# Altium footprint library CUSTOM PCB.PcbLib: 404 footprints (part 9 of 26)
Each footprint in its own frame and in the unit in brackets; x right, y up, seen from the top. Pads: shape width x height; smd on the part's side, far side on the other; paste and mask are expansions set on the pad; w line width, h text height; cw(c..) or ccw(c..) is an arc to the next point about the centre after c.
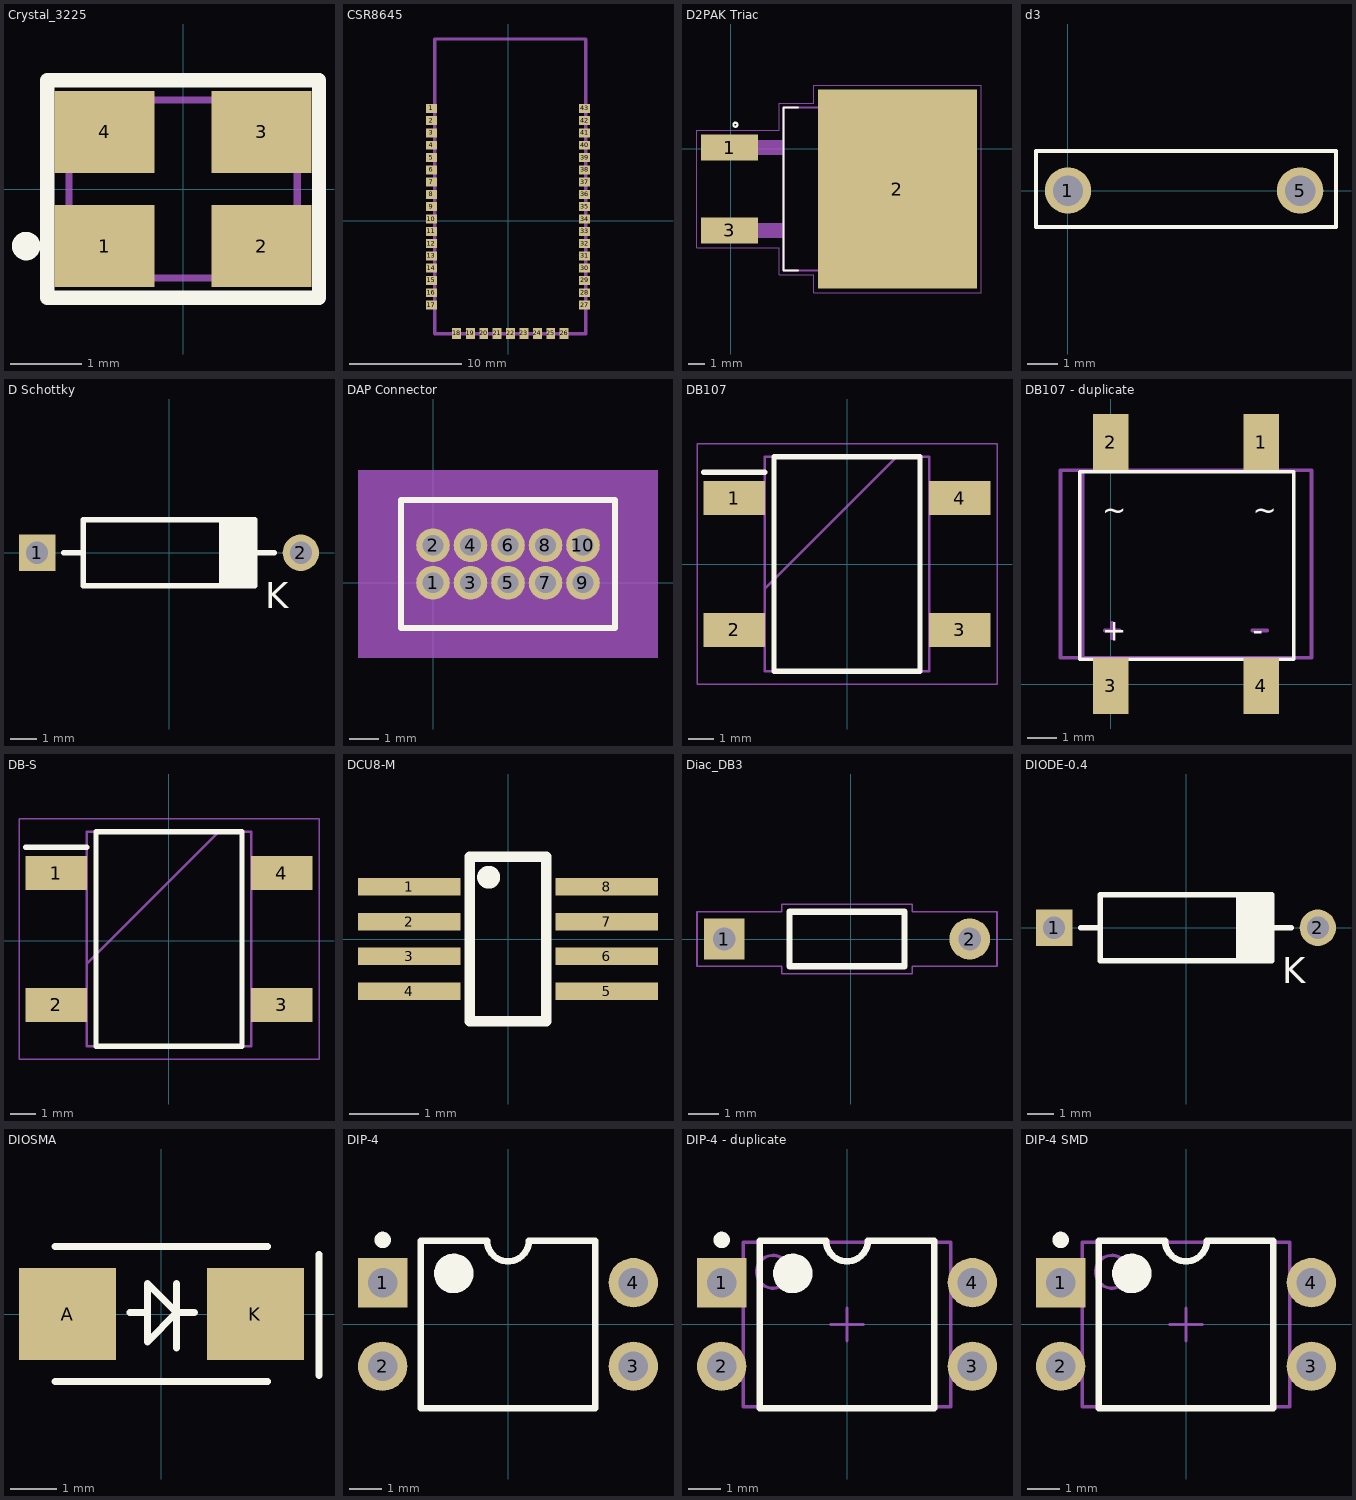
[diagram p8: the footprints below, top view; thin cyan lines are the x and y axes]

## Crystal_3225 [mm] "3225 pack"
pads (4):
  rect 1.4x1.15 smd: 1(-1.1,-0.8) 2(1.1,-0.8) 3(1.1,0.8) 4(-1.1,0.8)
Top Overlay:
  circle w0.2: c-2.2,-0.8 r0.1
  lines w0.2: -1.905,-1.524 1.905,-1.524 1.905,1.524 -1.905,1.524 -1.905,-1.524
Mechanical 15:
  lines w0.1: -1.6,-1.25 1.6,-1.25 1.6,1.25 -1.6,1.25 -1.6,-1.25
3D body "User Library-tsx-3225.STEP": height 0.52, standoff -0.08, extent -1.6,-1.23 1.6,1.27

## CSR8645 [mm]
pads (43):
  rect 1x0.8 smd: 1(-6.858,10.07) 2(-6.858,8.97) 3(-6.858,7.87) 4(-6.858,6.77) 5(-6.858,5.67) 6(-6.858,4.57) 7(-6.858,3.47) 8(-6.858,2.37) 9(-6.858,1.27) 10(-6.858,0.17) 11(-6.858,-0.93) 12(-6.858,-2.03) 13(-6.858,-3.13) 14(-6.858,-4.23) 15(-6.858,-5.33) 16(-6.858,-6.43) 17(-6.858,-7.53) 27(6.858,-7.53) 28(6.858,-6.43) 29(6.858,-5.33) 30(6.858,-4.23) 31(6.858,-3.13) 32(6.858,-2.03) 33(6.858,-0.93) 34(6.858,0.17) 35(6.858,1.27) 36(6.858,2.37) 37(6.858,3.47) 38(6.858,4.57) 39(6.858,5.67) 40(6.858,6.77) 41(6.858,7.87) 42(6.858,8.97) 43(6.858,10.07)
  rect 0.8x1 smd: 18(-4.604,-10.07) 19(-3.372,-10.07) 20(-2.172,-10.07) 21(-0.972,-10.07) 22(0.228,-10.07) 23(1.428,-10.07) 24(2.628,-10.07) 25(3.828,-10.07) 26(5.028,-10.07)
Mechanical 1:
  lines w0.3: -6.554,-10.109 -6.554,16.281 6.946,16.281 6.946,-10.109 -6.554,-10.109

## D2PAK Triac [mm] "T850-6G"
pads (3):
  rect 3.5x1.6 smd: 1(-0.071,0.076) 3(-0.071,-5.004)
  rect 9.75x12.2 smd: 2(10.204,-2.464)
Top Overlay:
  circle w0.127: c0.279,1.473 r0.127
  lines w0.127: 4.115,-7.464 3.229,-7.464 3.229,2.536 4.115,2.536
Top Paste:
  region: 7.939,-0.102 6.559,-0.102 6.559,1.366 7.939,1.366
  region: 8.531,1.366 9.909,1.366 9.909,-0.102 8.531,-0.102
  region: 7.939,-6.298 6.559,-6.298 6.559,-4.824 7.939,-4.824
  region: 8.532,-4.824 9.909,-4.824 9.909,-6.298 8.532,-6.298
  region: 8.531,-2.759 9.909,-2.759 9.909,-4.23 8.531,-4.23
  region: 8.532,-0.699 9.909,-0.699 9.909,-2.168 8.532,-2.168
  region: 7.939,-2.168 6.559,-2.168 6.559,-0.699 7.939,-0.699
  region: 7.939,-4.23 6.559,-4.23 6.559,-2.759 7.939,-2.759
  region: 12.48,-4.824 13.849,-4.824 13.849,-6.301 12.48,-6.301
  region: 11.879,-6.3 10.506,-6.3 10.506,-4.824 11.879,-4.824
  region: 12.474,1.366 13.849,1.366 13.849,-0.102 12.474,-0.102
  region: 11.879,-0.101 10.503,-0.101 10.503,1.366 11.879,1.366
  region: 11.879,-2.168 10.506,-2.168 10.506,-0.699 11.879,-0.699
  region: 11.879,-4.231 10.504,-4.231 10.504,-2.759 11.879,-2.759
  region: 12.473,-2.759 13.849,-2.759 13.849,-4.23 12.473,-4.23
  region: 12.479,-0.699 13.849,-0.699 13.849,-2.168 12.479,-2.168
Mechanical 4:
  region: -1.587,-4.554 3.229,-4.554 3.229,-5.46 -1.587,-5.46
  region: -1.586,0.526 3.229,0.526 3.229,-0.37 -1.586,-0.37
  region: -1.587,-4.554 3.229,-4.554 3.229,-5.46 -1.587,-5.46
  region: -1.586,0.526 3.229,0.526 3.229,-0.37 -1.586,-0.37
  lines w0.127: 3.229,-7.464 3.229,2.536 ; 3.229,-7.464 14.029,-7.464 ; 3.229,-7.464 3.229,2.536 ; 3.229,-7.464 14.029,-7.464 ; 3.229,2.536 14.029,2.536 ; 3.229,2.536 14.029,2.536 ; 14.029,-7.464 14.029,2.536 ; 14.029,-7.464 14.029,2.536
Mechanical 16:
  lines w0.05: -2.071,-6.064 -2.071,1.136 2.979,1.136 2.979,2.786 5.079,2.786 5.079,3.886 15.329,3.886 15.329,-8.814 5.079,-8.814 5.079,-7.714 2.979,-7.714 2.979,-6.064 -2.071,-6.064
3D body "TO263-2-1.stp": height 4.22, standoff 0, extent -1.086,-7.349 13.499,2.472
3D body: height 0.25, standoff 0, extent 21.666,-0.152 21.666,-0.152

## d3 [mil] "Schottky"
pads (2):
  round 60 hole 39.37: 1(0,0) 5(300,0)
Top Overlay:
  lines w5: -41.34,-47.24 -41.34,51.18 346.46,51.18 346.46,-47.24 -41.34,-47.24

## D Schottky [mm] "Diode, Thru-Hole; 2 Leads; 0.4 in Pin Spacing"
height 2.54
pads (2):
  rect 1.4x1.4 hole 0.85: 1(-5.08,0)
  round 1.4 hole 0.85: 2(5.08,0)
Top Overlay:
  lines w0.2: -4.064,0 -3.302,0 ; 2.032,-1.27 2.032,1.27 ; 3.302,0 4.064,0 ; -3.302,-1.27 3.302,-1.27 3.302,1.27 -3.302,1.27 -3.302,-1.27
  lines w0.5: 2.325,1.054 2.325,-1.05 3.04,-1.05 3.04,1.025 2.6,1.025 ; 2.65,-0.775 2.675,-0.775 ; 2.65,-0.525 2.65,0.675
  text "K" at 3.702,-2.137 h1
3D body "do-41.STEP": height 2, standoff -2.5, extent -5.457,-1.031 5.343,0.979

## DAP Connector [mil] "XMC1100 programmer connector 10 pin"
pads (10):
  round 45 hole 27.95: 1(0,0) 2(0,50) 3(50,0) 4(50,50) 5(100,0) 6(100,50) 7(150,0) 8(150,50) 9(200,0) 10(200,50)
Top Overlay:
  lines w7.87: -42.72,-60.24 242.72,-60.24 242.72,110.24 -42.72,110.24 -42.72,-60.24
Top Solder:
  circle w0: c0,0 r24.51
  circle w0: c0,50 r24.51
  circle w0: c50,0 r24.51
  circle w0: c50,50 r24.51
  circle w0: c100,0 r24.51
  circle w0: c100,50 r24.51
  circle w0: c150,0 r24.51
  circle w0: c150,50 r24.51
  circle w0: c200,0 r24.51
  circle w0: c200,50 r24.51
Bottom Solder:
  circle w0: c0,0 r24.51
  circle w0: c0,50 r24.51
  circle w0: c50,0 r24.51
  circle w0: c50,50 r24.51
  circle w0: c100,0 r24.51
  circle w0: c100,50 r24.51
  circle w0: c150,0 r24.51
  circle w0: c150,50 r24.51
  circle w0: c200,0 r24.51
  circle w0: c200,50 r24.51
Mechanical 1:
  region: -100,-100 -100,150 300,150 300,-100
  lines w3.94: -25,-42.48 25,-42.48 ; -25,-42.48 25,-42.48 ; -25,-42.48 -25,92.48 ; -25,92.48 25,92.48 ; -25,92.48 25,92.48 ; -7.99,-7.99 -7.99,7.99 ; -7.99,-7.99 7.99,-7.99 ; -7.99,-7.99 7.99,-7.99 ; -7.99,-7.99 -7.99,7.99 ; -7.99,7.99 7.99,7.99 ; -7.99,7.99 7.99,7.99 ; -7.99,42.01 -7.99,57.99 ; -7.99,42.01 7.99,42.01 ; -7.99,42.01 7.99,42.01 ; -7.99,42.01 -7.99,57.99 ; -7.99,57.99 7.99,57.99 ; -7.99,57.99 7.99,57.99 ; 7.99,-7.99 7.99,7.99 ; 7.99,-7.99 7.99,7.99 ; 7.99,42.01 7.99,57.99 ; 7.99,42.01 7.99,57.99 ; 25,-42.48 75,-42.48 ; 25,-42.48 75,-42.48 ; 25,92.48 75,92.48 ; 25,92.48 75,92.48 ; 42.01,-7.99 42.01,7.99 ; 42.01,-7.99 57.99,-7.99 ; 42.01,-7.99 57.99,-7.99 ; 42.01,-7.99 42.01,7.99 ; 42.01,7.99 57.99,7.99 ; 42.01,7.99 57.99,7.99 ; 42.01,42.01 42.01,57.99 ; 42.01,42.01 57.99,42.01 ; 42.01,42.01 57.99,42.01 ; 42.01,42.01 42.01,57.99 ; 42.01,57.99 57.99,57.99 ; 42.01,57.99 57.99,57.99 ; 57.99,-7.99 57.99,7.99 ; 57.99,-7.99 57.99,7.99 ; 57.99,42.01 57.99,57.99 ; 57.99,42.01 57.99,57.99 ; 75,-42.48 125,-42.48 ; 75,-42.48 125,-42.48 ; 75,92.48 125,92.48 ; 75,92.48 125,92.48 ; 92.01,-7.99 92.01,7.99 ; 92.01,-7.99 107.99,-7.99 ; 92.01,-7.99 107.99,-7.99 ; 92.01,-7.99 92.01,7.99 ; 92.01,7.99 107.99,7.99 ; 92.01,7.99 107.99,7.99 ; 92.01,42.01 92.01,57.99 ; 92.01,42.01 107.99,42.01 ; 92.01,42.01 107.99,42.01 ; 92.01,42.01 92.01,57.99 ; 92.01,57.99 107.99,57.99 ; 92.01,57.99 107.99,57.99 ; 107.99,-7.99 107.99,7.99 ; 107.99,-7.99 107.99,7.99 ; 107.99,42.01 107.99,57.99 ; 107.99,42.01 107.99,57.99 ; 125,-42.48 175,-42.48 ; 125,-42.48 175,-42.48 ; 125,92.48 175,92.48 ; 125,92.48 175,92.48 ; 142.01,-7.99 142.01,7.99 ; 142.01,-7.99 157.99,-7.99 ; 142.01,-7.99 157.99,-7.99 ; 142.01,-7.99 142.01,7.99 ; 142.01,7.99 157.99,7.99 ; 142.01,7.99 157.99,7.99 ; 142.01,42.01 142.01,57.99 ; 142.01,42.01 157.99,42.01 ; 142.01,42.01 157.99,42.01 ; 142.01,42.01 142.01,57.99 ; 142.01,57.99 157.99,57.99 ; 142.01,57.99 157.99,57.99 ; 157.99,-7.99 157.99,7.99 ; 157.99,-7.99 157.99,7.99 ; 157.99,42.01 157.99,57.99 ; 157.99,42.01 157.99,57.99 ; 175,-42.48 225,-42.48 225,92.48 175,92.48 ; 192.01,-7.99 207.99,-7.99 207.99,7.99 192.01,7.99 192.01,-7.99 ; 192.01,42.01 207.99,42.01 207.99,57.99 192.01,57.99 192.01,42.01
Mechanical 4:
  region: -26.97,-44.49 -26.97,94.49 226.97,94.49 226.97,-44.49

## DB107 [mm]
pads (4):
  rect 2.375x1.3 smd: 1(-4.362,2.55) 2(-4.362,-2.55) 3(4.362,-2.55) 4(4.362,2.55)
Top Overlay:
  lines w0.2: -5.55,3.55 -3.175,3.55 ; -2.825,-4.15 -2.825,4.15 2.825,4.15 2.825,-4.15 -2.825,-4.15
Mechanical 15:
  lines w0.1: -3.175,-0.95 1.925,4.15 ; -3.175,-4.15 -3.175,4.15 3.175,4.15 3.175,-4.15 -3.175,-4.15
Mechanical 20:
  lines w0.05: -5.8,-4.65 -5.8,4.65 5.8,4.65 5.8,-4.65 -5.8,-4.65
3D body "DB107S.stp": height 3.4, standoff 0, extent -5.026,-4.125 4.874,4.175

## DB107 - duplicate [mm]
pads (4):
  rect 1.2x1.9 smd: 1(5.09,8.188) 2(-0.01,8.188) 3(-0.01,-0.062) 4(5.09,-0.062)
Top Overlay:
  lines w0.127: -1.051,0.838 6.188,0.838 6.188,7.188 -1.051,7.188 -1.051,0.838
  text "-" at 4.791,1.473 h0.71
  text "~" at 4.791,5.537 h0.71
  text "+" at -0.289,1.473 h0.71
  text "~" at -0.289,5.537 h0.71
Mechanical 1:
  lines w0.127: -0.96,7.234 -0.96,0.888 ; -0.21,1.814 0.29,1.814 ; 0.04,1.564 0.04,2.064 ; 4.79,1.814 5.29,1.814 ; -0.96,0.888 -1.71,0.888 -1.71,7.238 6.79,7.238 6.79,0.888 -0.96,0.888
3D body "SDIP4L.stp": height 3.65, standoff 0.04, extent -1.678,-1.041 6.809,9.201

## DB-S [mm] "Rectifier IC"
pads (4):
  rect 2.375x1.3 smd: 1(-4.362,2.614) 2(-4.362,-2.486) 3(4.362,-2.486) 4(4.362,2.614)
Top Overlay:
  lines w0.2: -5.55,3.614 -3.175,3.614 ; -2.825,-4.086 2.825,-4.086 2.825,4.214 -2.825,4.214 -2.825,-4.086
Mechanical 15:
  lines w0.1: -3.175,-0.886 1.925,4.214 ; -3.175,-4.086 3.175,-4.086 3.175,4.214 -3.175,4.214 -3.175,-4.086
Mechanical 20:
  lines w0.05: -5.8,-4.586 5.8,-4.586 5.8,4.714 -5.8,4.714 -5.8,-4.586
3D body "DB107S.stp": height 3.4, standoff 0, extent -4.95,-4.15 4.95,4.15

## DCU8-M [mil]
pads (8):
  rect 58x10 smd paste+0 mask+0: 1(-56,29.53) 2(-56,9.84) 3(-56,-9.84) 4(-56,-29.53) 5(56,-29.53) 6(56,-9.84) 7(56,9.84) 8(56,29.53)
Top Overlay:
  circle w7: c-11,35 r3
  lines w6: -21.68,-46.5 21.68,-46.5 21.68,46.5 -21.68,46.5 -21.68,-46.5
3D body "DCU8.step": height 35.12, standoff 0, extent -62.99,-41.5 62.99,41.5

## Diac_DB3 [mm]
pads (2):
  rect 1.35x1.35 hole 0.75: 1(-4.177,0)
  round 1.35 hole 0.75: 2(3.923,0)
Top Overlay:
  lines w0.2: -2.027,-0.9 -2.027,0.9 1.773,0.9 1.773,-0.9 -2.027,-0.9
Mechanical 4:
  lines w0.05: -5.077,-0.9 -2.277,-0.9 -2.277,-1.15 2.023,-1.15 2.023,-0.9 4.823,-0.9 4.823,0.9 2.023,0.9 2.023,1.15 -2.277,1.15 -2.277,0.9 -5.077,0.9 -5.077,-0.9

## DIODE-0.4 [mm] "Diode, Thru-Hole; 2 Leads; 0.4 in Pin Spacing"
height 2.54
pads (2):
  rect 1.4x1.4 hole 0.85: 1(-5.08,0)
  round 1.4 hole 0.85: 2(5.08,0)
Top Overlay:
  lines w0.2: -4.064,0 -3.302,0 ; 2.032,-1.27 2.032,1.27 ; 3.302,0 4.064,0 ; -3.302,-1.27 -3.302,1.27 3.302,1.27 3.302,-1.27 -3.302,-1.27
  lines w0.5: 2.325,1.054 2.325,-1.05 3.04,-1.05 3.04,1.025 2.6,1.025 ; 2.65,-0.775 2.675,-0.775 ; 2.65,-0.525 2.65,0.675
  text "K" at 3.702,-2.137 h1
3D body "do-41.STEP": height 2, standoff -2.5, extent -5.457,-1.031 5.343,0.979

## DIOSMA [mm]
pads (2):
  rect 2.1x2 smd: A(-2.032,0) K(2.032,0)
Top Overlay:
  lines w0.15: -2.3,-1.46 2.3,-1.46 ; -2.3,1.46 2.3,1.46 ; -0.686,0.029 -0.305,0.029 ; 0.33,-0.733 0.33,0.664 ; 0.711,0.029 0.33,0.029 ; 3.409,-1.332 3.409,1.293 ; 0.33,0.029 -0.305,-0.606 -0.305,0.664 0.33,0.029
3D body "DO-214AC(SMA).x_t": height 2.29, standoff 0, extent -2.744,-1.397 2.743,1.397

## DIP-4 [mm] "DIP; 4 Leads; Row Spacing 7.62 mm; Pitch 2.54 mm"
height 5.6
pads (4):
  rect 1.5x1.5 hole 0.9: 1(-3.81,1.27)
  round 1.5 hole 0.9: 2(-3.81,-1.27) 3(3.81,-1.27) 4(3.81,1.27)
Top Overlay:
  circle w0.6: c-1.65,1.55 r0.3
  circle w0.25: c-3.81,2.57 r0.125
  lines w0.2: -2.65,-2.55 2.65,-2.55 2.65,2.55 0.635,2.55 cw(c0,2.55) -0.635,2.55 -2.65,2.55 -2.65,-2.55
3D body "CircuitWorks-DIP4.step": height 3.31, standoff -4.28, extent -4,-2.77 4,2.77

## DIP-4 - duplicate [mm] "DIP; 4 Leads; Row Spacing 7.62 mm; Pitch 2.54 mm"
height 5.6
pads (4):
  rect 1.5x1.5 hole 0.9: 1(-3.81,1.27)
  round 1.5 hole 0.9: 2(-3.81,-1.27) 3(3.81,-1.27) 4(3.81,1.27)
Top Overlay:
  circle w0.25: c-3.81,2.57 r0.125
  circle w0.6: c-1.65,1.55 r0.3
  lines w0.2: -2.65,-2.55 -2.65,2.55 -0.635,2.55 ccw(c0,2.55) 0.635,2.55 2.65,2.55 2.65,-2.55 -2.65,-2.55
Mechanical 13:
  circle w0.1: c-2.25,1.6 r0.5
  lines w0.1: -3.15,-2.5 -3.15,2.5 3.15,2.5 3.15,-2.5 -3.15,-2.5
Mechanical 15:
  lines w0.1: -0.5,0 0.5,0 ; 0,-0.5 0,0.5
3D body "IC_4P.stp": height 3.81, standoff -3.37, extent -3.935,-2.5 3.935,2.58

## DIP-4 SMD [mm] "DIP; 4 Leads; Row Spacing 7.62 mm; Pitch 2.54 mm"
height 5.6
pads (4):
  rect 1.5x1.5 hole 0.9: 1(-3.81,1.27)
  round 1.5 hole 0.9: 2(-3.81,-1.27) 3(3.81,-1.27) 4(3.81,1.27)
Top Overlay:
  circle w0.6: c-1.65,1.55 r0.3
  circle w0.25: c-3.81,2.57 r0.125
  lines w0.2: -2.65,-2.55 2.65,-2.55 2.65,2.55 0.635,2.55 cw(c0,2.55) -0.635,2.55 -2.65,2.55 -2.65,-2.55
Mechanical 13:
  circle w0.1: c-2.25,1.6 r0.5
  lines w0.1: -3.15,-2.5 3.15,-2.5 3.15,2.5 -3.15,2.5 -3.15,-2.5
Mechanical 15:
  lines w0.1: -0.5,0 0.5,0 ; 0,-0.5 0,0.5
3D body "User Library-DIP4_opto_iso.step": height 3.94, standoff 0.04, extent -5.015,-2.416 5.015,2.416